# Altium footprint library Connectors.PcbLib: 79 footprints (part 3 of 5)
Each footprint in its own frame and in the unit in brackets; x right, y up, seen from the top. Pads: shape width x height; smd on the part's side, far side on the other; paste and mask are expansions set on the pad; w line width, h text height; cw(c..) or ccw(c..) is an arc to the next point about the centre after c.
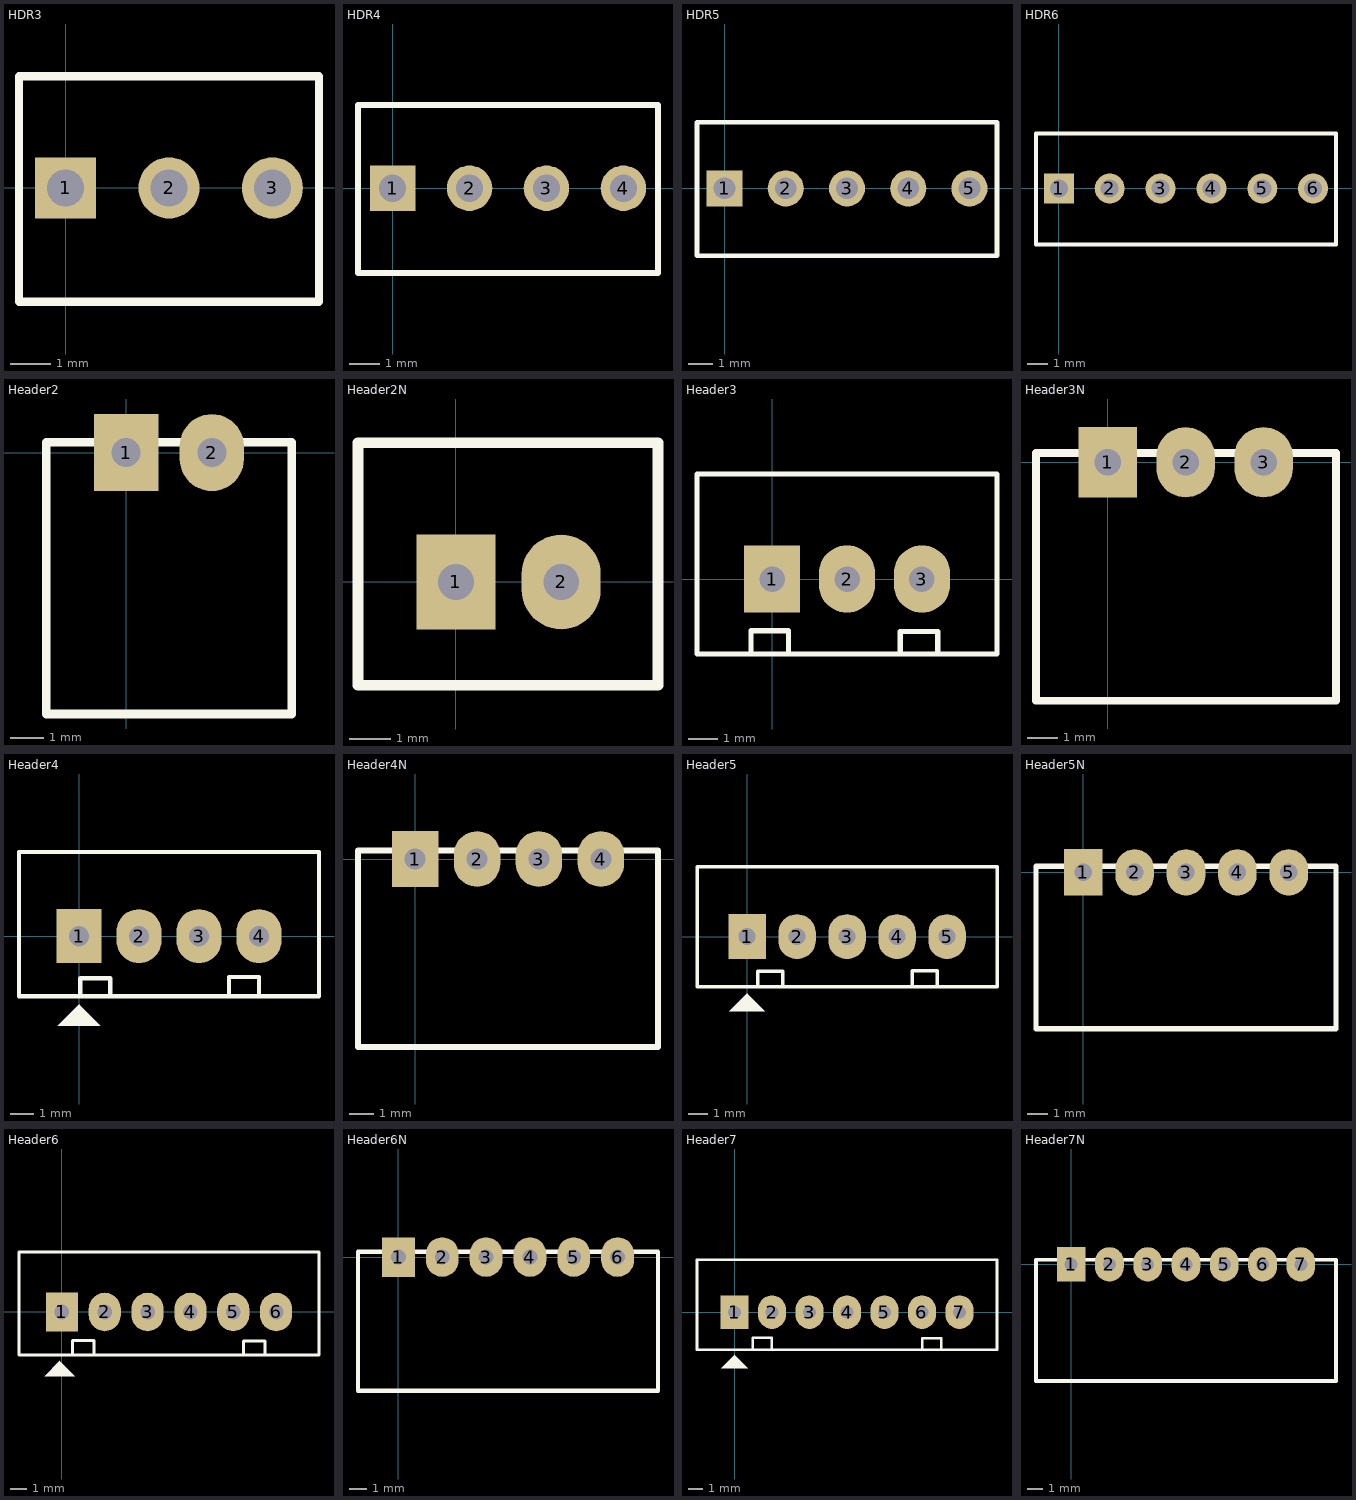
[diagram p2: the footprints below, top view; thin cyan lines are the x and y axes]

## HDR3 [mm] "Connector; Header; 3 Position"
pads (3):
  rect 1.5x1.5 hole 0.9: 1(0,0)
  round 1.5 hole 0.9: 2(2.54,0) 3(5.08,0)
Top Overlay:
  lines w0.2: -1.143,-2.794 6.223,-2.794 6.223,2.743 -1.143,2.743 -1.143,-2.794
3D body "h3.stp": height 11.72, standoff -3.54, extent -1.27,-2.92 6.35,2.88

## HDR4 [mm] "Connector; Header; 4 Position"
pads (4):
  rect 1.5x1.5 hole 0.9: 1(0,0)
  round 1.5 hole 0.9: 2(2.54,0) 3(5.08,0) 4(7.62,0)
Top Overlay:
  lines w0.2: -1.143,-2.794 8.763,-2.794 8.763,2.743 -1.143,2.743 -1.143,-2.794
3D body "h4.stp": height 11.72, standoff -3.54, extent -1.27,-2.92 8.89,2.88

## HDR5 [mm] "Connector; Header; 5 Position"
pads (5):
  rect 1.5x1.5 hole 0.9: 1(0,0)
  round 1.5 hole 0.9: 2(2.54,0) 3(5.08,0) 4(7.62,0) 5(10.16,0)
Top Overlay:
  lines w0.2: -1.143,-2.794 11.303,-2.794 11.303,2.743 -1.143,2.743 -1.143,-2.794
3D body "h5.stp": height 11.72, standoff -3.54, extent -1.27,-2.92 11.43,2.88

## HDR6 [mm] "Connector; Header; 6 Position"
pads (6):
  rect 1.5x1.5 hole 0.9: 1(0,0)
  round 1.5 hole 0.9: 2(2.54,0) 3(5.08,0) 4(7.62,0) 5(10.16,0) 6(12.7,0)
Top Overlay:
  lines w0.2: -1.143,-2.794 13.843,-2.794 13.843,2.743 -1.143,2.743 -1.143,-2.794
3D body "h6.stp": height 11.72, standoff -3.54, extent -1.27,-2.92 13.97,2.88

## Header2 [mil] "CON2"
height 200
pads (2):
  rect 75x90 hole 34: 1(0,0)
  oval 75x90 hole 34: 2(100,0)
Top Overlay:
  lines w10: -93,-305 193,-305 193,12 -93,12 -93,-305
3D body "JST - XH - Thru R - 2Pin - 2.54mm.stp": height 230, standoff -133, extent -92,-304.47 192,11.92

## Header2N [mil] "CON2"
height 200
pads (2):
  rect 75x90 hole 34: 1(0,0)
  oval 75x90 hole 34: 2(100,0)
Top Overlay:
  lines w10: -93,-98 192,-98 192,132 -93,132 -93,-98
3D body "JST - XH - Thru V - 2Pin - 2.54mm.stp": height 284, standoff -118, extent -92.39,-98 191.61,132

## Header3 [mil] "CON 3"
height 200
pads (3):
  rect 75x90 hole 34: 1(0,0)
  oval 75x90 hole 34: 2(100,0) 3(200,0)
Top Overlay:
  lines w7: -28,-99 -28,-69 22,-69 22,-99 ; 171,-100 171,-70 221,-70 221,-100 ; -100,-100 -100,140 300,140 300,0 300,-100 -100,-100
3D body "SW3dPS-jst-b3b-xh-a.STEP": height 275.59, standoff -133.86, extent -94.88,-90 294.88,136.38

## Header3N [mil] "CON 3"
height 200
pads (3):
  rect 75x90 hole 34: 1(0,0)
  oval 75x90 hole 34: 2(100,0) 3(200,0)
Top Overlay:
  lines w10: -92,-306 293,-306 293,12 -92,12 -92,-306
3D body "JST - XH - Thru R - 3Pin - 2.54mm.stp": height 230, standoff -133, extent -92,-304.47 292,11.92

## Header4 [mil] "CON4"
height 200
pads (4):
  rect 75x90 hole 34: 1(0,0)
  oval 75x90 hole 34: 2(100,0) 3(200,0) 4(300,0)
Top Overlay:
  region: -35.5,-149.5 35.5,-149.5 0.5,-114.5 0.5,-113.5
  lines w7: 2,-100 2,-70 52,-70 52,-100 ; 250,-98 250,-68 300,-68 300,-98 ; -100,-100 -100,140 400,140 400,0 400,-100 -100,-100
3D body "User Library-XH2_54-4P_step.step": height 275.59, standoff -70.87, extent -91.97,-90.99 400.16,137.36

## Header4N [mil] "CON4"
height 200
pads (4):
  rect 75x90 hole 34: 1(0,0)
  oval 75x90 hole 34: 2(100,0) 3(200,0) 4(300,0)
Top Overlay:
  lines w10: -92,-303 392,-303 392,14 -92,14 -92,-303
3D body "JST - XH - Thru R - 4Pin - 2.54mm.stp": height 230, standoff -133, extent -92,-302.5 392,13.89

## Header5 [mil] "CON5"
height 200
pads (5):
  rect 75x90 hole 34: 1(0,0)
  oval 75x90 hole 34: 2(100,0) 3(200,0) 4(300,0) 5(400,0)
Top Overlay:
  region: -35.5,-149.5 35.5,-149.5 0.5,-114.5 0.5,-113.5
  lines w7: 21,-99 21,-69 71,-69 71,-99 ; 330,-98 330,-68 380,-68 380,-98 ; -100,-100 -100,140 500,140 500,0 500,-100 -100,-100
3D body "User Library-XH2_54-5P-1.step": height 275.59, standoff -70.87, extent -96.06,-94.49 496.07,133.86

## Header5N [mil] "CON5"
height 200
pads (5):
  rect 75x90 hole 34: 1(0,0)
  oval 75x90 hole 34: 2(100,0) 3(200,0) 4(300,0) 5(400,0)
Top Overlay:
  lines w10: -92,-304.47 492,-304.47 492,11.92 -92,11.92 -92,-304.47
3D body "JST - XH - Thru R - 5Pin - 2.54mm.stp": height 230, standoff -133, extent -92,-304.47 492,11.92

## Header6 [mil] "CON6"
height 200
pads (6):
  rect 75x90 hole 34: 1(0,0)
  oval 75x90 hole 34: 2(100,0) 3(200,0) 4(300,0) 5(400,0) 6(500,0)
Top Overlay:
  region: -40.5,-149.5 30.5,-149.5 -4.5,-114.5 -4.5,-113.5
  lines w7: 25,-97 25,-67 75,-67 75,-97 ; 424,-98 424,-68 474,-68 474,-98 ; -100,-100 -100,140 600,140 600,0 600,-100 -100,-100
3D body "User Library-JST - XH - Thru (V) - 6Pin - 2_54mm (1).step": height 284, standoff -118, extent -92.39,-100.36 591.61,129.64

## Header6N [mil] "CON6"
height 200
pads (6):
  rect 75x90 hole 34: 1(0,0)
  oval 75x90 hole 34: 2(100,0) 3(200,0) 4(300,0) 5(400,0) 6(500,0)
Top Overlay:
  lines w10: -92,-304.47 592,-304.47 592,11.92 -92,11.92 -92,-304.47
3D body "JST - XH - Thru R - 6Pin - 2.54mm.stp": height 230, standoff -133, extent -92,-304.47 592,11.92

## Header7 [mil] "CON7"
height 200
pads (7):
  rect 75x90 hole 34: 1(0,0)
  oval 75x90 hole 34: 2(100,0) 3(200,0) 4(300,0) 5(400,0) 6(500,0) 7(600,0)
Top Overlay:
  region: -35.5,-149.5 35.5,-149.5 0.5,-114.5 0.5,-113.5
  lines w7: 49,-98 49,-68 99,-68 99,-98 ; 501,-99 501,-69 551,-69 551,-99 ; -100,-100 -100,140 700,140 700,0 700,-100 -100,-100
3D body "JST - XH - Thru V - 7Pin - 2.54mm.stp": height 284, standoff -118, extent -92,-98 692,132

## Header7N [mil] "CON7"
height 200
pads (7):
  rect 75x90 hole 34: 1(0,0)
  oval 75x90 hole 34: 2(100,0) 3(200,0) 4(300,0) 5(400,0) 6(500,0) 7(600,0)
Top Overlay:
  lines w10: -92,-304.47 692,-304.47 692,11.92 -92,11.92 -92,-304.47
3D body "JST - XH - Thru R - 7Pin - 2.54mm.stp": height 230, standoff -133, extent -92,-304.47 692,11.92